# Altium footprint library SMotlaq-PCB_lib.PcbLib: 186 footprints (part 1 of 12)
Each footprint in its own frame and in the unit in brackets; x right, y up, seen from the top. Pads: shape width x height; smd on the part's side, far side on the other; paste and mask are expansions set on the pad; w line width, h text height; cw(c..) or ccw(c..) is an arc to the next point about the centre after c.
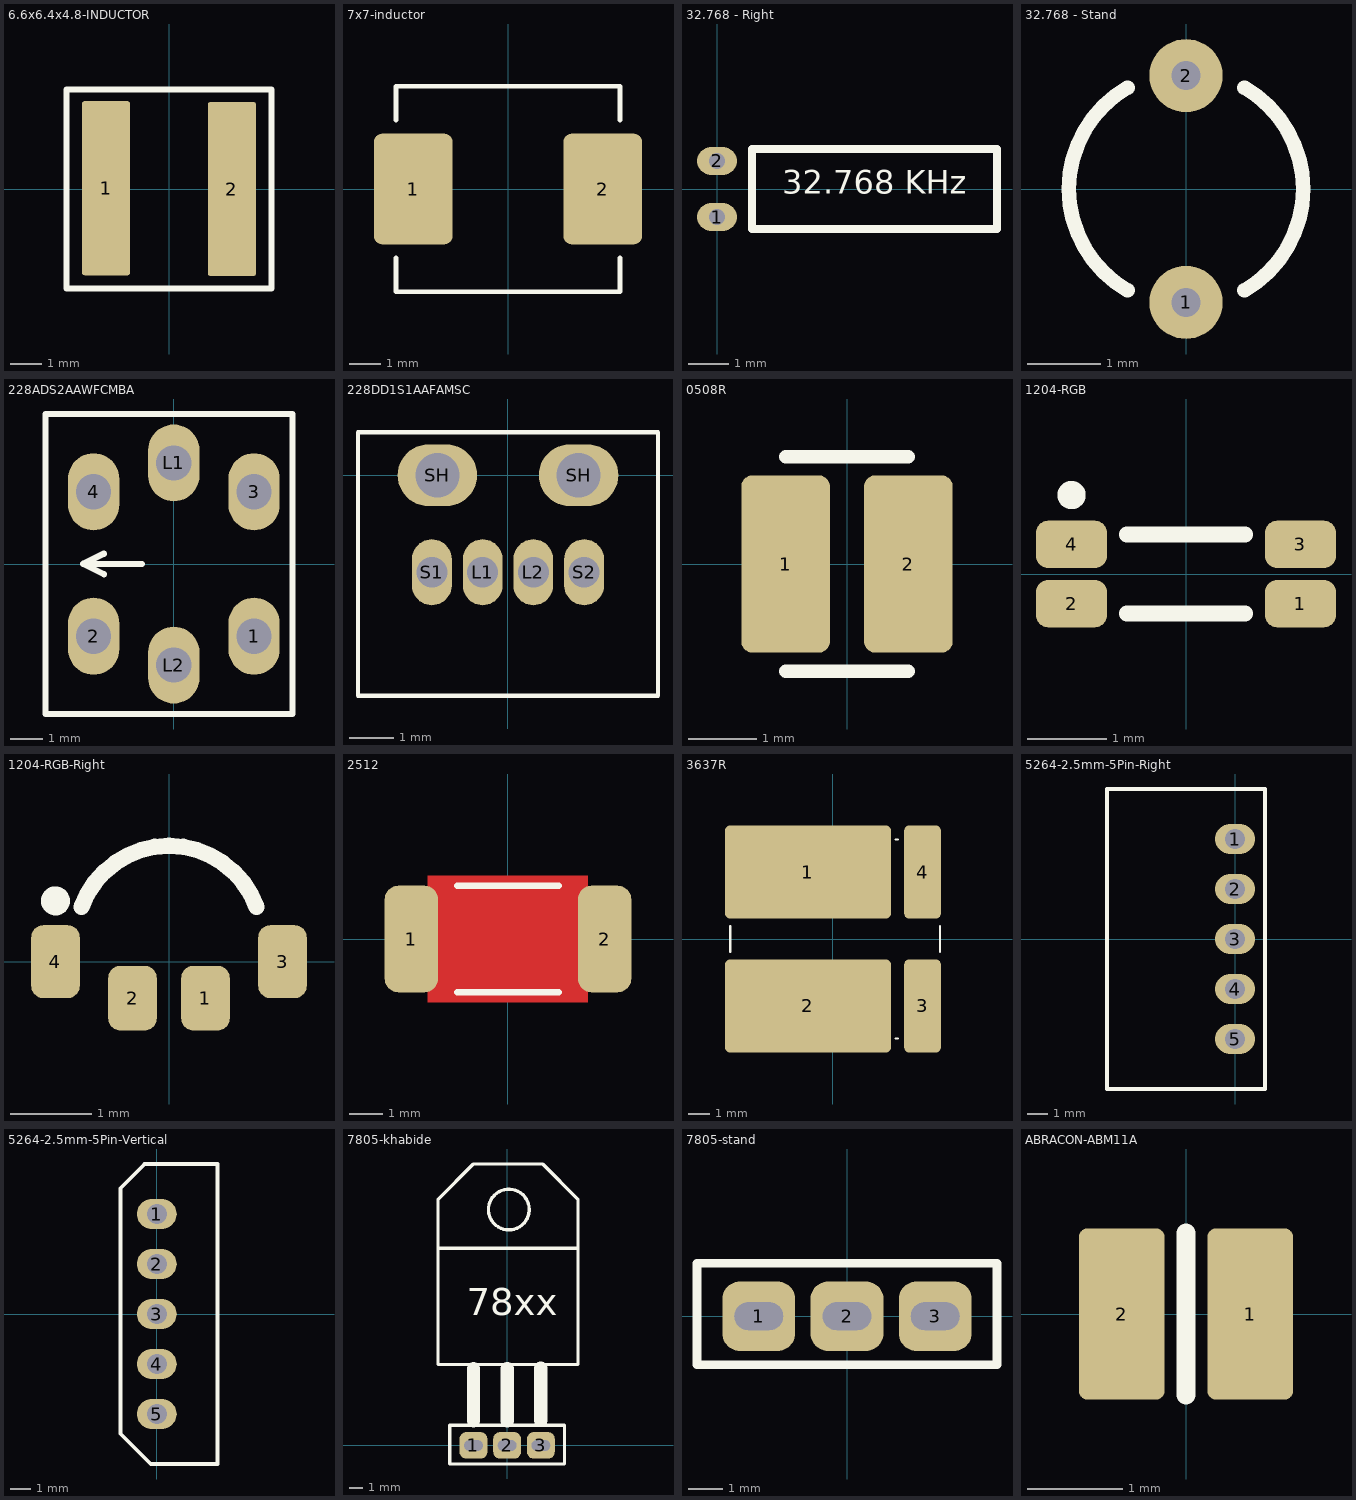
[diagram p0: the footprints below, top view; thin cyan lines are the x and y axes]

## 6.6x6.4x4.8-INDUCTOR [mm]
height 3
pads (2):
  rrect10% 1.55x5.6 smd mask+0.1: 1(-2.025,0.025) 2(2.025,0)
Top Overlay:
  lines w0.2: -3.3,-3.2 -3.3,3.2 3.3,3.2 3.3,-3.2 -3.3,-3.2
3D body "MPL-AL6050-3R3.stp": height 5.1, standoff 0, extent -3.3,-3.2 3.3,3.2

## 7x7-inductor [mm]
height 3
pads (2):
  rrect20% 2.5x3.5 smd: 1(-3,0) 2(3,0)
Top Overlay:
  lines w0.15: -3.55,-2.175 -3.55,-3.25 3.55,-3.25 3.55,-2.175 ; -3.55,2.175 -3.55,3.25 3.55,3.25 3.55,2.175
3D body "inductor.STEP": height 2.2, standoff 0, extent -3.55,-3.25 3.55,3.25

## 32.768 - Right [mm]
pads (2):
  rrect100% 1x0.7 hole 0.4: 1(0,-0.7) 2(0,0.7)
Top Overlay:
  lines w0.2: 2.025,1 0.875,1 ; 0.875,1 7,1 7,-1 0.875,-1 0.875,1
  text "32.768 KHz" at 1.63,-0.316 h1
3D body "User Library-DT-26-1.STEP": height 2.1, standoff -1.9, extent -0.14,-1 7,1

## 32.768 - Stand [mm]
pads (2):
  rrect100% 1x1 hole 0.4: 1(0,-1.55) 2(0,1.55)
Top Overlay:
  lines w0.2: -0.8,-1.386 cw(c0,0) -0.8,1.386 ; 0.8,-1.386 ccw(c0,0) 0.8,1.386
3D body "User Library-Crystal TH.step": height 9.28, standoff -1.5, extent -1.6,-1.725 1.6,1.725

## 228ADS2AAWFCMBA [mm]
height 7
pads (6):
  oval 1.6x2.4 hole 1.1: 1(2.5,-2.25) 2(-2.5,-2.25) 3(2.5,2.25) 4(-2.5,2.25) L1(0,3.15) L2(0,-3.15)
Top Overlay:
  lines w0.2: -2.827,0.005 -2.177,-0.32 ; -2.175,0.325 -2.825,0 -1,0 ; -4,-4.675 3.7,-4.675 ; -4,-4.675 3.7,-4.675 ; -4,-4.675 -4,4.675 3.7,4.675 3.7,-4.675
3D body "228ADS2AAWFCMBA.stp": height 7.36, standoff -2.42, extent -13.499,-4.15 3.201,4.15

## 228DD1S1AAFAMSC [mm]
height 6.2
pads (6):
  oval 0.9x1.5 hole 0.7: L1(-0.575,-2.2) L2(0.575,-2.2) S1(-1.725,-2.2) S2(1.725,-2.2)
  oval 1.8x1.4 hole 1: SH(-1.6,0) SH(1.6,0)
Top Overlay:
  lines w0.1: -3.4,-5 1.6,-5 3.4,-5 ; -3.4,-5 3.4,-5 ; -3.4,-5 -3.4,0.975 3.4,0.975 3.4,-5

## 0508R [mm]
height 0.5
pads (2):
  rrect25% 1.3x2.6 smd: 1(-0.9,0) 2(0.9,0)
Top Overlay:
  lines w0.2: -0.9,-1.575 0.9,-1.575 ; -0.9,1.575 0.9,1.575
3D body "User Library-RESC1220X07N.STEP": height 0.7, standoff 0, extent -0.675,-1.05 0.675,1.05

## 1204-RGB [mm]
pads (4):
  rrect50% 0.9x0.6 smd mask+0.075: 1(1.45,-0.375) 2(-1.45,-0.375) 3(1.45,0.375) 4(-1.45,0.375)
Top Overlay:
  circle w0.2: c-1.45,1 r0.079
  lines w0.2: -0.75,-0.5 0.75,-0.5 ; -0.75,0.5 0.75,0.5
3D body "User Library-RGB1204.step": height 1.49, standoff 0, extent -1.6,-0.5 1.6,0.5

## 1204-RGB-Right [mm]
pads (4):
  rrect50% 0.6x0.8 smd mask+0.075: 1(0.45,-0.45) 2(-0.45,-0.45)
  rrect50% 0.6x0.9 smd mask+0.075: 3(1.4,0) 4(-1.4,0)
Top Overlay:
  circle w0.2: c-1.4,0.75 r0.079
  lines w0.2: -1.081,0.673 cw(c0,0.28) 1.081,0.673
3D body "User Library-RGB1204.step": height 1, standoff 0, extent -1.6,-0.25 1.6,1.242

## 2512 [mm]
pads (2):
  rrect50% 1.6x3.2 smd: 1(-2.9,0) 2(2.9,0)
Top Layer:
  pour cut-out: -2.4,1.9 2.4,1.9 2.4,-1.9 -2.4,-1.9
Top Overlay:
  lines w0.2: -1.525,-1.6 1.525,-1.6 ; -1.525,1.6 1.525,1.6
3D body "WSL2512...18 (0.0005 to 0.00099).STEP": height 0.66, standoff 0, extent -3.175,-1.59 3.175,1.59

## 3637R [mm]
height 0.5
pads (4):
  rrect10% 7.62x4.27 smd: 1(-1.13,3.075) 2(-1.13,-3.075)
  rrect25% 1.68x4.27 smd: 3(4.13,-3.075) 4(4.13,3.075)
Top Overlay:
  lines w0.1: -4.7,-0.6 -4.7,0.6 ; 2.9,-4.57 3,-4.57 ; 2.9,4.57 3,4.57 ; 4.925,-0.6 4.925,0.6
3D body "WSL36371L000DEA.stp": height 0.64, standoff 0, extent -4.475,-4.57 4.925,4.57

## 5264-2.5mm-5Pin-Right [mm]
pads (5):
  oval 2x1.5 hole 1: 1(0,5) 2(0,2.5) 3(0,0) 4(0,-2.5) 5(0,-5)
Top Overlay:
  lines w0.2: -6.4,-7.5 1.5,-7.5 1.5,7.5 -6.4,7.5 -6.4,-7.5
3D body "x2564wr-05-n0sn.stp": height 4.95, standoff -3.45, extent -6.4,-7.5 1.5,7.5

## 5264-2.5mm-5Pin-Vertical [mm]
pads (5):
  oval 2x1.5 hole 1: 1(0,5) 2(0,2.5) 3(0,0) 4(0,-2.5) 5(0,-5)
Top Overlay:
  lines w0.2: -1.825,-5.975 -1.825,6.275 -0.6,7.5 3.05,7.5 3.05,-7.5 -0.3,-7.5 -1.825,-5.975
3D body "x2564wv-05-n0sn.stp": height 5.9, standoff -3.5, extent -1.85,-7.5 3.05,7.5

## 7805-khabide [mm]
pads (3):
  rrect50% 2.1x2 hole 1.4 slot 0.8 at 90 deg: 1(-2.54,0) 2(0,0) 3(2.54,0)
Top Overlay:
  lines w0.254: -5.207,14.859 5.334,14.859 ; 1.66,17.71 cw(c0.127,17.78) 1.662,17.78 ; -5.207,6.096 5.334,6.096 5.334,18.542 2.667,21.209 -2.54,21.209 -5.207,18.542 -5.207,6.096 ; -4.318,-1.397 -4.318,1.524 4.318,1.524 4.318,-1.397 -4.318,-1.397
  lines w1: -2.54,1.841 -2.54,5.779 ; 0,1.841 0,5.779 ; 2.54,1.905 2.54,5.842
  text "78xx" at -3.048,9.144 h3.5
3D body "User Library-TO-220-2.STEP": height 11.39, standoff -1.31, extent -5.873,-0.254 5.842,21.844

## 7805-stand [mm]
pads (3):
  rrect50% 2.1x2 hole 1.4 slot 0.8 at 90 deg: 1(-2.54,0) 2(0,0) 3(2.54,0)
Top Overlay:
  lines w0.254: -4.318,-1.397 -4.318,1.524 4.318,1.524 4.318,-1.397 -4.318,-1.397
3D body "User Library-7805.STEP": height 20.12, standoff -10.25, extent -5.335,-1.524 5.335,3.176

## ABRACON-ABM11A [mm]
height 0.7
pads (2):
  rrect20% 0.9x1.8 smd mask+0.1: 1(0.675,0) 2(-0.675,0)
Top Overlay:
  lines w0.2: 0,-0.85 0,0 0,0.85
3D body "User Library-ABM11.step": height 0.59, standoff 0, extent -1,-0.8 1,0.8